# Altium footprint library Dip Switches.PcbLib: 39 footprints (part 2 of 3)
Each footprint in its own frame and in the unit in brackets; x right, y up, seen from the top. Pads: shape width x height; smd on the part's side, far side on the other; paste and mask are expansions set on the pad; w line width, h text height; cw(c..) or ccw(c..) is an arc to the next point about the centre after c.
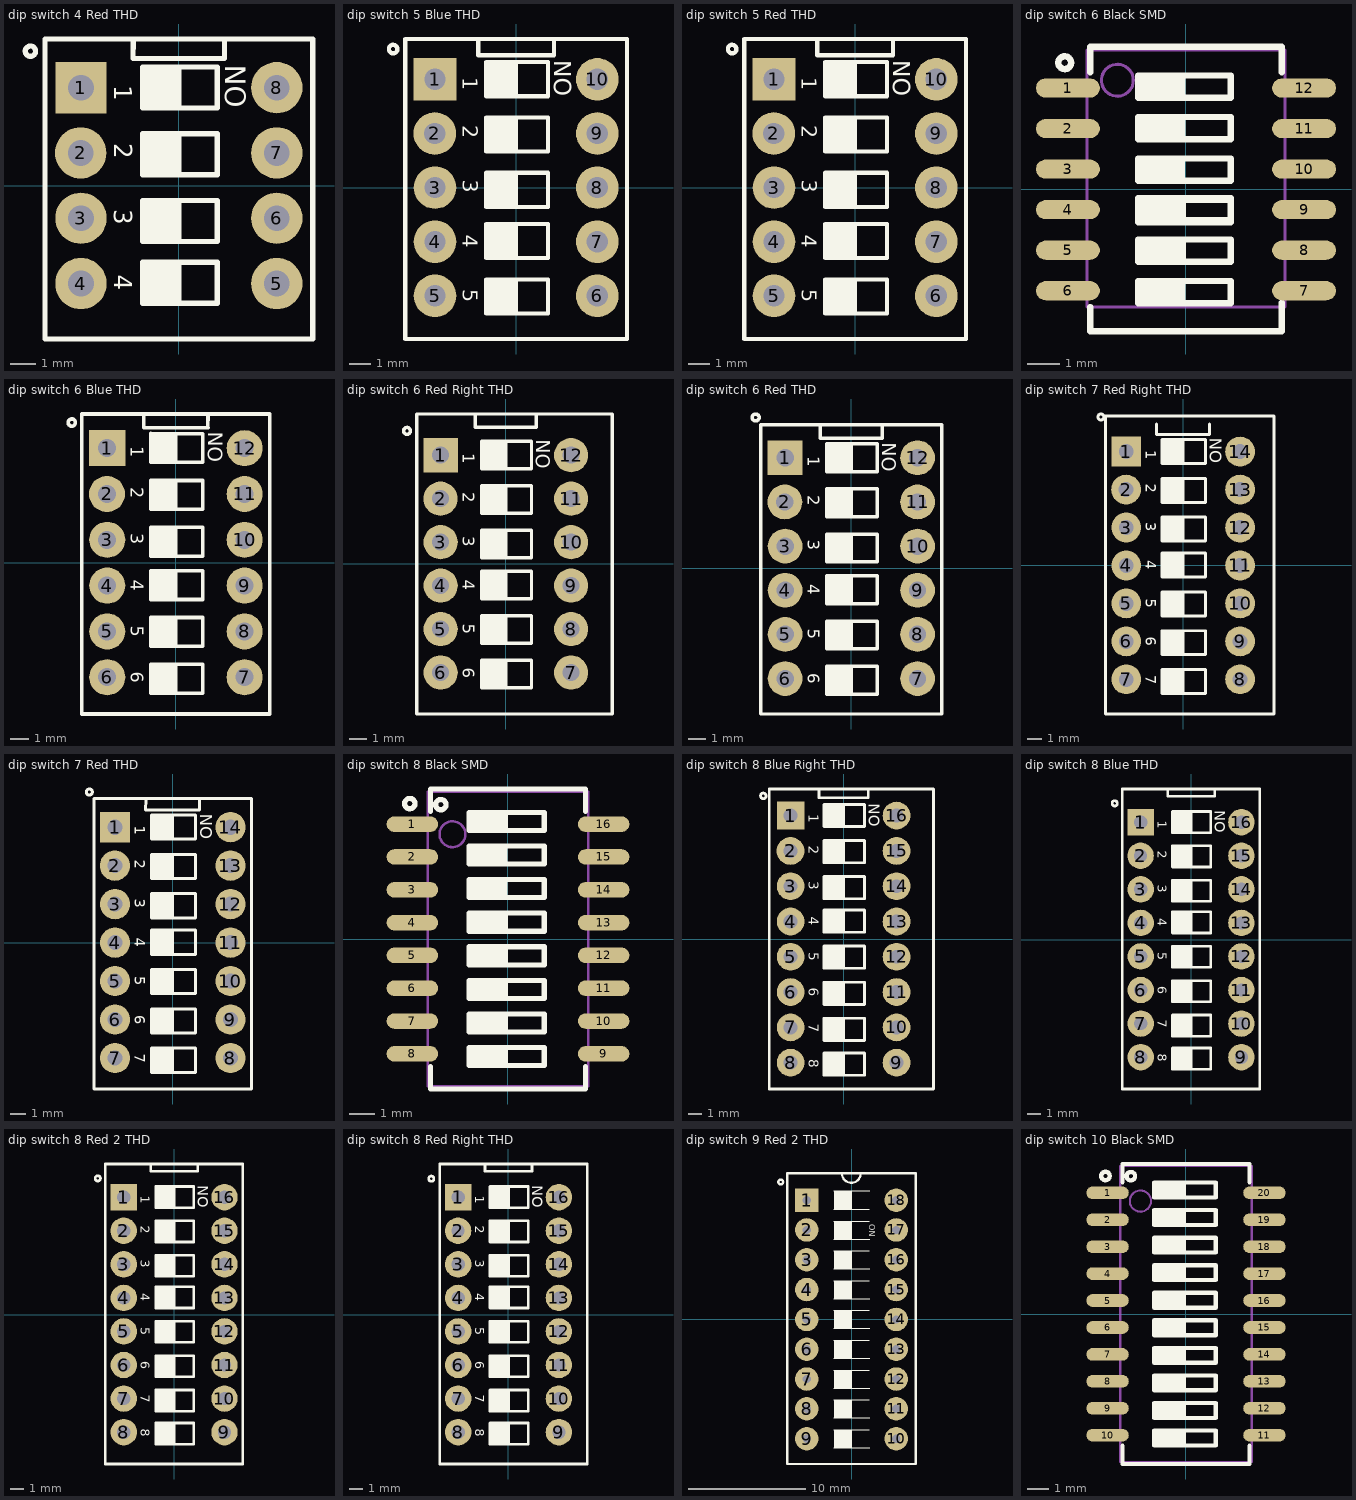
[diagram p1: the footprints below, top view; thin cyan lines are the x and y axes]

## dip switch 4 Red THD [mm]
height 6.5
pads (8):
  rect 2x2 hole 1: 1(-3.805,3.81)
  round 2 hole 1: 2(-3.815,1.27) 3(-3.805,-1.27) 4(-3.805,-3.81) 5(3.815,-3.81) 6(3.815,-1.27) 7(3.815,1.27) 8(3.815,3.81)
Top Overlay:
  circle w0.2: c-5.771,5.23 r0.2
  rectangle: -1.4,-4.58 0.1,-2.98
  rectangle: -1.4,-2.18 0.1,-0.58
  rectangle: -1.4,0.42 0.1,2.02
  rectangle: -1.4,3.02 0.1,4.62
  lines w0.2: -1.782,4.942 -1.773,5.656 ; -1.773,4.942 1.783,4.942 ; 1.774,4.942 1.783,5.656 ; -5.207,-5.969 -5.207,5.704 5.212,5.704 5.212,-5.969 -5.207,-5.969 ; -1.4,-4.58 1.5,-4.58 1.5,-2.98 -1.4,-2.98 -1.4,-4.58 ; -1.4,-2.18 1.5,-2.18 1.5,-0.58 -1.4,-0.58 -1.4,-2.18 ; -1.4,0.42 -1.4,2.02 1.5,2.02 1.5,0.42 -1.4,0.42 ; -1.4,3.02 -1.4,4.62 1.5,4.62 1.5,3.02 -1.4,3.02
  text "4" at -2.51,-3.474 h0.7
  text "3" at -2.51,-0.913 h0.7
  text "1" at -2.51,3.911 h0.7
  text "2" at -2.51,1.647 h0.7
  text "ON" at 2.6,3.02 h0.8
Mechanical 1:
  circle w0.025: c3.816,-3.803 r0.254
  circle w0.025: c-3.804,-3.803 r0.254
  circle w0.025: c3.816,-1.263 r0.254
  circle w0.025: c-3.804,-1.263 r0.254
  circle w0.025: c3.816,1.277 r0.254
  circle w0.025: c-3.814,1.277 r0.254
  circle w0.025: c3.816,3.817 r0.254
  circle w0.025: c-3.804,3.817 r0.254
3D body: height 6.35, standoff 0.25, extent -1.441,3.055 -0.73,4.579
3D body: height 0.76, standoff 0, extent 3.563,3.563 4.07,4.07
3D body: height 0.76, standoff 0, extent 3.563,1.023 4.07,1.53
3D body: height 0.76, standoff 0, extent 3.563,-1.517 4.07,-1.01
3D body: height 0.76, standoff 0, extent 3.563,-4.057 4.07,-3.55
3D body: height 0.76, standoff 0, extent -4.057,3.563 -3.55,4.07
3D body: height 0.76, standoff 0, extent -4.067,1.023 -3.56,1.53
3D body: height 0.76, standoff 0, extent -4.057,-1.517 -3.55,-1.01
3D body: height 0.76, standoff 0, extent -4.057,-4.057 -3.55,-3.55
3D body: height 3.81, standoff 0, extent -1.904,5.29 1.906,5.798
3D body: height 5.08, standoff 0.25, extent -0.73,3.055 1.449,4.579
3D body: height 5.08, standoff 0.25, extent -0.73,-2.025 1.449,-0.501
3D body: height 6.35, standoff 0.25, extent -1.441,-2.025 -0.73,-0.501
3D body: height 5.08, standoff 0.25, extent -0.73,-4.565 1.449,-3.041
3D body: height 6.35, standoff 0.25, extent -1.441,-4.565 -0.73,-3.041
3D body: height 5.59, standoff 0, extent -1.441,-3.041 1.449,-2.025
3D body: height 5.08, standoff 0.25, extent -0.73,0.515 1.449,2.039
3D body: height 6.35, standoff 0.25, extent -1.441,0.515 -0.73,2.039
3D body: height 5.59, standoff 0, extent -1.441,2.039 1.449,3.055
3D body: height 5.59, standoff 0, extent -1.441,4.579 1.449,5.29
3D body: height 5.59, standoff 0, extent -1.441,-0.501 1.449,0.515
3D body: height 5.59, standoff 0, extent -4.947,-5.835 4.959,5.798
3D body: height 0.25, standoff 0.05, extent -4.947,-5.835 4.959,5.798

## dip switch 5 Blue THD [mm]
height 6.5
pads (10):
  rect 2x2 hole 1: 1(-3.805,5.08)
  round 2 hole 1: 2(-3.815,2.54) 3(-3.805,0) 4(-3.805,-2.54) 5(-3.805,-5.08) 6(3.815,-5.08) 7(3.815,-2.54) 8(3.815,0) 9(3.815,2.54) 10(3.815,5.08)
Top Overlay:
  circle w0.2: c-5.771,6.5 r0.2
  rectangle: -1.4,4.29 0.1,5.89
  rectangle: -1.4,1.69 0.1,3.29
  rectangle: -1.4,-0.91 0.1,0.69
  rectangle: -1.4,-3.31 0.1,-1.71
  rectangle: -1.4,-5.91 0.1,-4.31
  lines w0.2: -1.782,6.212 -1.773,6.926 ; -1.773,6.212 1.783,6.212 ; 1.774,6.212 1.783,6.926 ; -5.207,-7.108 5.212,-7.108 5.212,6.974 -5.207,6.974 -5.207,-7.108 ; -1.4,-5.91 -1.4,-4.31 1.5,-4.31 1.5,-5.91 -1.4,-5.91 ; -1.4,-3.31 -1.4,-1.71 1.5,-1.71 1.5,-3.31 -1.4,-3.31 ; -1.4,-0.91 -1.4,0.69 1.5,0.69 1.5,-0.91 -1.4,-0.91 ; -1.4,1.69 -1.4,3.29 1.5,3.29 1.5,1.69 -1.4,1.69 ; -1.4,4.29 -1.4,5.89 1.5,5.89 1.5,4.29 -1.4,4.29
  text "5" at -2.51,-4.764 h0.7
  text "4" at -2.51,-2.204 h0.7
  text "ON" at 2.6,4.29 h0.8
  text "2" at -2.51,2.917 h0.7
  text "3" at -2.51,0.357 h0.7
  text "1" at -2.51,5.181 h0.7
3D body "User Library-DIP-10.step": height 7, standoff -3.7, extent -4.947,-6.85 4.953,6.85

## dip switch 5 Red THD [mm]
height 6.5
pads (10):
  rect 2x2 hole 1: 1(-3.805,5.08)
  round 2 hole 1: 2(-3.815,2.54) 3(-3.805,0) 4(-3.805,-2.54) 5(-3.805,-5.08) 6(3.815,-5.08) 7(3.815,-2.54) 8(3.815,0) 9(3.815,2.54) 10(3.815,5.08)
Top Overlay:
  circle w0.2: c-5.771,6.5 r0.2
  rectangle: -1.4,4.29 0.1,5.89
  rectangle: -1.4,1.69 0.1,3.29
  rectangle: -1.4,-0.91 0.1,0.69
  rectangle: -1.4,-3.31 0.1,-1.71
  rectangle: -1.4,-5.91 0.1,-4.31
  lines w0.2: -1.782,6.212 -1.773,6.926 ; -1.773,6.212 1.783,6.212 ; 1.774,6.212 1.783,6.926 ; -5.207,-7.108 5.212,-7.108 5.212,6.974 -5.207,6.974 -5.207,-7.108 ; -1.4,-5.91 -1.4,-4.31 1.5,-4.31 1.5,-5.91 -1.4,-5.91 ; -1.4,-3.31 -1.4,-1.71 1.5,-1.71 1.5,-3.31 -1.4,-3.31 ; -1.4,-0.91 -1.4,0.69 1.5,0.69 1.5,-0.91 -1.4,-0.91 ; -1.4,1.69 -1.4,3.29 1.5,3.29 1.5,1.69 -1.4,1.69 ; -1.4,4.29 -1.4,5.89 1.5,5.89 1.5,4.29 -1.4,4.29
  text "ON" at 2.6,4.29 h0.8
  text "1" at -2.51,5.181 h0.7
  text "2" at -2.51,2.917 h0.7
  text "3" at -2.51,0.357 h0.7
  text "4" at -2.51,-2.204 h0.7
  text "5" at -2.51,-4.764 h0.7
3D body "User Library-DS1040-05 (DIP_switch).step": height 6.8, standoff -3.85, extent -4.947,-7.207 4.953,6.953

## dip switch 6 Black SMD [mm] "SWITCH DIP 6POS, SMD, 1.27mm, 6.1X6.2mm , TDA series"
height 2.3
pads (12):
  oval 2x0.6 smd: 1(-3.7,3.175) 2(-3.7,1.905) 3(-3.7,0.635) 4(-3.7,-0.635) 5(-3.7,-1.905) 6(-3.7,-3.175) 7(3.7,-3.175) 8(3.7,-1.905) 9(3.7,-0.635) 10(3.7,0.635) 11(3.7,1.905) 12(3.7,3.175)
Top Overlay:
  circle w0.2: c-3.8,3.97 r0.2
  rectangle: -1.519,-3.531 -0.019,-2.931
  rectangle: -1.496,-2.232 0.004,-1.632
  rectangle: -1.5,-0.87 0,-0.27
  rectangle: -1.5,-0.93 0,-0.33
  rectangle: -1.533,0.318 -0.033,0.918
  rectangle: -1.521,1.651 -0.021,2.251
  rectangle: -1.509,2.937 -0.009,3.537
  lines w0.2: -3,-3.683 -3,-4.445 3,-4.445 3,-3.556 ; -3,3.67 -3,4.47 3,4.47 3,3.67 ; -1.5,-3.57 -1.5,-2.87 1.4,-2.87 1.4,-3.57 -1.5,-3.57 ; -1.5,-2.27 -1.5,-1.57 1.4,-1.57 1.4,-2.27 -1.5,-2.27 ; -1.5,-1.03 -1.5,-0.33 1.4,-0.33 1.4,-1.03 -1.5,-1.03 ; -1.5,-0.97 -1.5,-0.27 1.4,-0.27 1.4,-0.97 -1.5,-0.97 ; -1.5,0.27 -1.5,0.97 1.4,0.97 1.4,0.27 -1.5,0.27 ; -1.5,1.57 -1.5,2.27 1.4,2.27 1.4,1.57 -1.5,1.57 ; -1.5,2.87 -1.5,3.57 1.4,3.57 1.4,2.87 -1.5,2.87
Mechanical 13:
  circle w0.1: c-2.15,3.42 r0.5
  lines w0.1: -3.1,-3.683 -3.1,4.37 3.1,4.37 3.1,-3.683 -3.1,-3.683
3D body "User Library-DHN-06F.STEP": height 1.6, standoff 0, extent -3.35,-4.45 3.35,4.45

## dip switch 6 Blue THD [mm]
height 6.5
pads (12):
  rect 2x2 hole 1: 1(-3.805,6.35)
  round 2 hole 1: 2(-3.815,3.81) 3(-3.805,1.27) 4(-3.805,-1.27) 5(-3.805,-3.81) 6(-3.805,-6.35) 7(3.815,-6.35) 8(3.815,-3.81) 9(3.815,-1.27) 10(3.815,1.27) 11(3.815,3.81) 12(3.815,6.35)
Top Overlay:
  circle w0.2: c-5.771,7.77 r0.2
  rectangle: -1.4,-7.24 0.1,-5.64
  rectangle: -1.4,-4.64 0.1,-3.04
  rectangle: -1.4,-2.04 0.1,-0.44
  rectangle: -1.4,0.36 0.1,1.96
  rectangle: -1.4,2.96 0.1,4.56
  rectangle: -1.4,5.56 0.1,7.16
  lines w0.2: -1.782,7.482 -1.773,8.196 ; -1.773,7.482 1.783,7.482 ; 1.774,7.482 1.783,8.196 ; -5.207,-8.389 -5.207,8.244 5.212,8.244 5.212,-8.389 -5.207,-8.389 ; -1.4,-7.24 1.5,-7.24 1.5,-5.64 -1.4,-5.64 -1.4,-7.24 ; -1.4,-4.64 1.5,-4.64 1.5,-3.04 -1.4,-3.04 -1.4,-4.64 ; -1.4,-2.04 1.5,-2.04 1.5,-0.44 -1.4,-0.44 -1.4,-2.04 ; -1.4,0.36 1.5,0.36 1.5,1.96 -1.4,1.96 -1.4,0.36 ; -1.4,2.96 1.5,2.96 1.5,4.56 -1.4,4.56 -1.4,2.96 ; -1.4,5.56 1.5,5.56 1.5,7.16 -1.4,7.16 -1.4,5.56
  text "6" at -2.51,-6.055 h0.7
  text "5" at -2.51,-3.494 h0.7
  text "4" at -2.51,-0.934 h0.7
  text "3" at -2.51,1.627 h0.7
  text "2" at -2.51,4.187 h0.7
  text "1" at -2.51,6.451 h0.7
  text "ON" at 2.6,5.56 h0.8
3D body "User Library-106S.STEP": height 6.97, standoff -1.89, extent -4.815,-8.319 4.885,8.381

## dip switch 6 Red Right THD [mm]
height 6.5
pads (12):
  rect 2x2 hole 1: 1(-3.805,6.35)
  round 2 hole 1: 2(-3.815,3.81) 3(-3.805,1.27) 4(-3.805,-1.27) 5(-3.805,-3.81) 6(-3.805,-6.35) 7(3.815,-6.35) 8(3.815,-3.81) 9(3.815,-1.27) 10(3.815,1.27) 11(3.815,3.81) 12(3.815,6.35)
Top Overlay:
  circle w0.2: c-5.771,7.77 r0.2
  rectangle: -1.4,5.56 0.1,7.16
  rectangle: -1.4,2.96 0.1,4.56
  rectangle: -1.4,0.36 0.1,1.96
  rectangle: -1.4,-2.04 0.1,-0.44
  rectangle: -1.4,-4.64 0.1,-3.04
  rectangle: -1.4,-7.24 0.1,-5.64
  lines w0.2: -1.782,7.99 -1.773,8.704 ; -1.773,7.99 1.783,7.99 ; 1.774,7.99 1.783,8.704 ; -5.207,-8.77 6.227,-8.77 6.227,8.756 -5.207,8.756 -5.207,-8.77 ; -1.4,-7.24 -1.4,-5.64 1.5,-5.64 1.5,-7.24 -1.4,-7.24 ; -1.4,-4.64 -1.4,-3.04 1.5,-3.04 1.5,-4.64 -1.4,-4.64 ; -1.4,-2.04 -1.4,-0.44 1.5,-0.44 1.5,-2.04 -1.4,-2.04 ; -1.4,0.36 -1.4,1.96 1.5,1.96 1.5,0.36 -1.4,0.36 ; -1.4,2.96 -1.4,4.56 1.5,4.56 1.5,2.96 -1.4,2.96 ; -1.4,5.56 -1.4,7.16 1.5,7.16 1.5,5.56 -1.4,5.56
  text "ON" at 2.6,5.56 h0.8
  text "1" at -2.51,6.451 h0.7
  text "2" at -2.51,4.187 h0.7
  text "3" at -2.51,1.627 h0.7
  text "4" at -2.51,-0.934 h0.7
  text "5" at -2.51,-3.494 h0.7
  text "6" at -2.51,-6.055 h0.7
3D body "User Library-DIP SW 6P TH RA.step": height 7.9, standoff -3.8, extent -4.886,-8.717 6.034,8.703

## dip switch 6 Red THD [mm]
height 6.5
pads (12):
  rect 2x2 hole 1: 1(-3.805,6.35)
  round 2 hole 1: 2(-3.815,3.81) 3(-3.805,1.27) 4(-3.805,-1.27) 5(-3.805,-3.81) 6(-3.805,-6.35) 7(3.815,-6.35) 8(3.815,-3.81) 9(3.815,-1.27) 10(3.815,1.27) 11(3.815,3.81) 12(3.815,6.35)
Top Overlay:
  circle w0.2: c-5.5,8.67 r0.2
  rectangle: -1.4,-7.24 0.1,-5.64
  rectangle: -1.4,-4.64 0.1,-3.04
  rectangle: -1.4,-2.04 0.1,-0.44
  rectangle: -1.4,0.36 0.1,1.96
  rectangle: -1.4,2.96 0.1,4.56
  rectangle: -1.4,5.56 0.1,7.16
  lines w0.2: -1.782,7.482 -1.773,8.196 ; -1.773,7.482 1.783,7.482 ; 1.774,7.482 1.783,8.196 ; -5.207,-8.389 -5.207,8.244 5.212,8.244 5.212,-8.389 -5.207,-8.389 ; -1.4,-7.24 1.5,-7.24 1.5,-5.64 -1.4,-5.64 -1.4,-7.24 ; -1.4,-4.64 1.5,-4.64 1.5,-3.04 -1.4,-3.04 -1.4,-4.64 ; -1.4,-2.04 1.5,-2.04 1.5,-0.44 -1.4,-0.44 -1.4,-2.04 ; -1.4,0.36 1.5,0.36 1.5,1.96 -1.4,1.96 -1.4,0.36 ; -1.4,2.96 1.5,2.96 1.5,4.56 -1.4,4.56 -1.4,2.96 ; -1.4,5.56 1.5,5.56 1.5,7.16 -1.4,7.16 -1.4,5.56
  text "6" at -2.51,-6.055 h0.7
  text "5" at -2.51,-3.494 h0.7
  text "4" at -2.51,-0.934 h0.7
  text "3" at -2.51,1.627 h0.7
  text "2" at -2.51,4.187 h0.7
  text "1" at -2.51,6.451 h0.7
  text "ON" at 2.6,5.56 h0.8
3D body "User Library-DS1040-06 (DIP_switch).step": height 6.8, standoff -3.85, extent -4.955,-8.357 4.945,8.344

## dip switch 7 Red Right THD [mm]
height 6.5
pads (14):
  rect 2x2 hole 1: 1(-3.805,7.62)
  round 2 hole 1: 2(-3.815,5.08) 3(-3.805,2.54) 4(-3.805,0) 5(-3.805,-2.54) 6(-3.805,-5.08) 7(-3.805,-7.62) 8(3.815,-7.62) 9(3.815,-5.08) 10(3.815,-2.54) 11(3.815,0) 12(3.815,2.54) 13(3.815,5.08) 14(3.815,7.62)
Top Overlay:
  circle w0.2: c-5.5,9.94 r0.2
  rectangle: -1.4,-8.57 0.1,-6.97
  rectangle: -1.4,-5.97 0.1,-4.37
  rectangle: -1.4,-3.37 0.1,-1.77
  rectangle: -1.4,-0.77 0.1,0.83
  rectangle: -1.4,1.63 0.1,3.23
  rectangle: -1.4,4.23 0.1,5.83
  rectangle: -1.4,6.83 0.1,8.43
  lines w0.2: -1.782,8.752 -1.773,9.466 ; -1.773,8.752 1.783,8.752 ; 1.774,8.752 1.783,9.466 ; -5.207,-9.943 -5.207,9.996 6.088,9.996 6.088,-9.943 -5.207,-9.943 ; -1.4,-8.57 1.5,-8.57 1.5,-6.97 -1.4,-6.97 -1.4,-8.57 ; -1.4,-5.97 1.5,-5.97 1.5,-4.37 -1.4,-4.37 -1.4,-5.97 ; -1.4,-3.37 1.5,-3.37 1.5,-1.77 -1.4,-1.77 -1.4,-3.37 ; -1.4,-0.77 1.5,-0.77 1.5,0.83 -1.4,0.83 -1.4,-0.77 ; -1.4,1.63 1.5,1.63 1.5,3.23 -1.4,3.23 -1.4,1.63 ; -1.4,4.23 1.5,4.23 1.5,5.83 -1.4,5.83 -1.4,4.23 ; -1.4,6.83 1.5,6.83 1.5,8.43 -1.4,8.43 -1.4,6.83
  text "7" at -2.51,-7.345 h0.7
  text "6" at -2.51,-4.785 h0.7
  text "5" at -2.51,-2.224 h0.7
  text "4" at -2.51,0.336 h0.7
  text "3" at -2.51,2.897 h0.7
  text "2" at -2.51,5.457 h0.7
  text "1" at -2.51,7.721 h0.7
  text "ON" at 2.6,6.83 h0.8
3D body "User Library-DIP SW 7P TH RA.step": height 7.9, standoff -3.8, extent -4.897,-10.017 6.023,9.943

## dip switch 7 Red THD [mm]
height 6.5
pads (14):
  rect 2x2 hole 1: 1(-3.805,7.62)
  round 2 hole 1: 2(-3.815,5.08) 3(-3.805,2.54) 4(-3.805,0) 5(-3.805,-2.54) 6(-3.805,-5.08) 7(-3.805,-7.62) 8(3.815,-7.62) 9(3.815,-5.08) 10(3.815,-2.54) 11(3.815,0) 12(3.815,2.54) 13(3.815,5.08) 14(3.815,7.62)
Top Overlay:
  circle w0.2: c-5.5,9.94 r0.2
  rectangle: -1.4,6.83 0.1,8.43
  rectangle: -1.4,4.23 0.1,5.83
  rectangle: -1.4,1.63 0.1,3.23
  rectangle: -1.4,-0.77 0.1,0.83
  rectangle: -1.4,-3.37 0.1,-1.77
  rectangle: -1.4,-5.97 0.1,-4.37
  rectangle: -1.4,-8.57 0.1,-6.97
  lines w0.2: -1.782,8.752 -1.773,9.466 ; -1.773,8.752 1.783,8.752 ; 1.774,8.752 1.783,9.466 ; -5.207,-9.663 5.212,-9.663 5.212,9.514 -5.207,9.514 -5.207,-9.663 ; -1.4,-8.57 -1.4,-6.97 1.5,-6.97 1.5,-8.57 -1.4,-8.57 ; -1.4,-5.97 -1.4,-4.37 1.5,-4.37 1.5,-5.97 -1.4,-5.97 ; -1.4,-3.37 -1.4,-1.77 1.5,-1.77 1.5,-3.37 -1.4,-3.37 ; -1.4,-0.77 -1.4,0.83 1.5,0.83 1.5,-0.77 -1.4,-0.77 ; -1.4,1.63 -1.4,3.23 1.5,3.23 1.5,1.63 -1.4,1.63 ; -1.4,4.23 -1.4,5.83 1.5,5.83 1.5,4.23 -1.4,4.23 ; -1.4,6.83 -1.4,8.43 1.5,8.43 1.5,6.83 -1.4,6.83
  text "ON" at 2.6,6.83 h0.8
  text "1" at -2.51,7.721 h0.7
  text "2" at -2.51,5.457 h0.7
  text "3" at -2.51,2.897 h0.7
  text "4" at -2.51,0.336 h0.7
  text "5" at -2.51,-2.224 h0.7
  text "6" at -2.51,-4.785 h0.7
  text "7" at -2.51,-7.345 h0.7
3D body "User Library-DS1040-07 (DIP_switch).step": height 6.8, standoff -3.85, extent -4.954,-9.631 4.946,9.609

## dip switch 8 Black SMD [mm] "SWITCH DIP 8POS, SMD, 1.27mm, 6.1X11.3mm ,TDA series"
height 2.3
pads (16):
  oval 2x0.6 smd: 1(-3.7,4.445) 2(-3.7,3.175) 3(-3.7,1.905) 4(-3.7,0.635) 5(-3.7,-0.635) 6(-3.7,-1.905) 7(-3.7,-3.175) 8(-3.7,-4.445) 9(3.7,-4.445) 10(3.7,-3.175) 11(3.7,-1.905) 12(3.7,-0.635) 13(3.7,0.635) 14(3.7,1.905) 15(3.7,3.175) 16(3.7,4.445)
Top Overlay:
  circle w0.2: c-2.6,5.2 r0.2
  circle w0.2: c-3.8,5.24 r0.2
  rectangle: -1.508,4.278 -0.008,4.878
  rectangle: -1.517,2.975 -0.017,3.575
  rectangle: -1.517,1.628 -0.017,2.228
  rectangle: -1.508,0.361 -0.008,0.961
  rectangle: -1.505,-0.91 -0.005,-0.31
  rectangle: -1.505,-2.208 -0.005,-1.608
  rectangle: -1.501,-3.519 -0.001,-2.919
  rectangle: -1.5,-4.8 0,-4.2
  lines w0.2: -3,-4.94 -3,-5.805 3,-5.805 3,-4.94 ; -3,4.94 -3,5.805 3,5.805 3,4.94 ; -1.5,-4.9 1.4,-4.9 1.4,-4.2 -1.5,-4.2 -1.5,-4.9 ; -1.5,-3.6 1.4,-3.6 1.4,-2.9 -1.5,-2.9 -1.5,-3.6 ; -1.5,-2.3 1.4,-2.3 1.4,-1.6 -1.5,-1.6 -1.5,-2.3 ; -1.5,-1 1.4,-1 1.4,-0.3 -1.5,-0.3 -1.5,-1 ; -1.5,0.3 1.4,0.3 1.4,1 -1.5,1 -1.5,0.3 ; -1.5,1.6 1.4,1.6 1.4,2.3 -1.5,2.3 -1.5,1.6 ; -1.5,2.9 1.4,2.9 1.4,3.6 -1.5,3.6 -1.5,2.9 ; -1.5,4.2 1.4,4.2 1.4,4.9 -1.5,4.9 -1.5,4.2
Mechanical 13:
  circle w0.1: c-2.15,4.055 r0.5
  lines w0.1: -3.1,-5.705 3.1,-5.705 3.1,5.705 -3.1,5.705 -3.1,-5.705
3D body "218-8polesLP.STP": height 2.57, standoff -0.05, extent -4.22,-5.665 4.22,5.665

## dip switch 8 Blue Right THD [mm]
height 6.5
pads (16):
  rect 2x2 hole 1: 1(-3.805,8.89)
  round 2 hole 1: 2(-3.815,6.35) 3(-3.805,3.81) 4(-3.805,1.27) 5(-3.805,-1.27) 6(-3.805,-3.81) 7(-3.805,-6.35) 8(-3.805,-8.89) 9(3.815,-8.89) 10(3.815,-6.35) 11(3.815,-3.81) 12(3.815,-1.27) 13(3.815,1.27) 14(3.815,3.81) 15(3.815,6.35) 16(3.815,8.89)
Top Overlay:
  circle w0.2: c-5.771,10.31 r0.2
  rectangle: -1.4,-9.8 0.1,-8.2
  rectangle: -1.4,-7.3 0.1,-5.7
  rectangle: -1.4,-4.7 0.1,-3.1
  rectangle: -1.4,-2.1 0.1,-0.5
  rectangle: -1.4,0.5 0.1,2.1
  rectangle: -1.4,2.9 0.1,4.5
  rectangle: -1.4,5.5 0.1,7.1
  rectangle: -1.4,8.1 0.1,9.7
  lines w0.2: -1.773,10.795 -1.773,10.171 1.783,10.171 1.783,10.806 ; -5.34,-10.784 -5.34,10.806 6.471,10.806 6.471,-10.784 -5.34,-10.784 ; -1.4,-9.8 1.5,-9.8 1.5,-8.2 -1.4,-8.2 -1.4,-9.8 ; -1.4,-7.3 1.5,-7.3 1.5,-5.7 -1.4,-5.7 -1.4,-7.3 ; -1.4,-4.7 1.5,-4.7 1.5,-3.1 -1.4,-3.1 -1.4,-4.7 ; -1.4,-2.1 1.5,-2.1 1.5,-0.5 -1.4,-0.5 -1.4,-2.1 ; -1.4,0.5 1.5,0.5 1.5,2.1 -1.4,2.1 -1.4,0.5 ; -1.4,2.9 1.5,2.9 1.5,4.5 -1.4,4.5 -1.4,2.9 ; -1.4,5.5 1.5,5.5 1.5,7.1 -1.4,7.1 -1.4,5.5 ; -1.4,8.1 1.5,8.1 1.5,9.7 -1.4,9.7 -1.4,8.1
  text "8" at -2.51,-8.636 h0.7
  text "7" at -2.51,-6.075 h0.7
  text "6" at -2.51,-3.515 h0.7
  text "5" at -2.51,-0.954 h0.7
  text "4" at -2.51,1.606 h0.7
  text "3" at -2.51,4.167 h0.7
  text "2" at -2.51,6.727 h0.7
  text "1" at -2.51,8.991 h0.7
  text "ON" at 2.6,8.1 h0.8
3D body "User Library-Dip_Switch_Piano_8ways.STEP": height 9.2, standoff -3, extent -5.213,-10.612 6.387,10.888

## dip switch 8 Blue THD [mm] "SWITCH DIP 8POS, THD, 2.54mm"
height 6.5
pads (16):
  rect 2x2 hole 1: 1(-3.805,8.89)
  round 2 hole 1: 2(-3.815,6.35) 3(-3.805,3.81) 4(-3.805,1.27) 5(-3.805,-1.27) 6(-3.805,-3.81) 7(-3.805,-6.35) 8(-3.805,-8.89) 9(3.815,-8.89) 10(3.815,-6.35) 11(3.815,-3.81) 12(3.815,-1.27) 13(3.815,1.27) 14(3.815,3.81) 15(3.815,6.35) 16(3.815,8.89)
Top Overlay:
  circle w0.2: c-5.771,10.31 r0.2
  rectangle: -1.4,-9.8 0.1,-8.2
  rectangle: -1.4,-7.3 0.1,-5.7
  rectangle: -1.4,-4.7 0.1,-3.1
  rectangle: -1.4,-2.1 0.1,-0.5
  rectangle: -1.4,0.5 0.1,2.1
  rectangle: -1.4,2.9 0.1,4.5
  rectangle: -1.4,5.5 0.1,7.1
  rectangle: -1.4,8.1 0.1,9.7
  lines w0.2: -1.773,11.371 -1.773,10.863 1.783,10.863 1.783,11.371 ; -5.207,-11.3 -5.207,11.4 5.212,11.4 5.212,-11.3 -5.207,-11.3 ; -1.4,-9.8 1.5,-9.8 1.5,-8.2 -1.4,-8.2 -1.4,-9.8 ; -1.4,-7.3 1.5,-7.3 1.5,-5.7 -1.4,-5.7 -1.4,-7.3 ; -1.4,-4.7 1.5,-4.7 1.5,-3.1 -1.4,-3.1 -1.4,-4.7 ; -1.4,-2.1 1.5,-2.1 1.5,-0.5 -1.4,-0.5 -1.4,-2.1 ; -1.4,0.5 1.5,0.5 1.5,2.1 -1.4,2.1 -1.4,0.5 ; -1.4,2.9 1.5,2.9 1.5,4.5 -1.4,4.5 -1.4,2.9 ; -1.4,5.5 1.5,5.5 1.5,7.1 -1.4,7.1 -1.4,5.5 ; -1.4,8.1 1.5,8.1 1.5,9.7 -1.4,9.7 -1.4,8.1
  text "8" at -2.51,-8.636 h0.7
  text "7" at -2.51,-6.075 h0.7
  text "6" at -2.51,-3.515 h0.7
  text "5" at -2.51,-0.954 h0.7
  text "4" at -2.51,1.606 h0.7
  text "3" at -2.51,4.167 h0.7
  text "2" at -2.51,6.727 h0.7
  text "1" at -2.51,8.991 h0.7
  text "ON" at 2.6,8.1 h0.8
3D body "SW3dPS-DIP SWITCH 8 POS CTS 206.STEP": height 8.25, standoff -3.5, extent -4.895,-11.217 4.885,11.283

## dip switch 8 Red 2 THD [mm]
height 6.5
pads (16):
  rect 2x2 hole 1: 1(-3.805,8.89)
  round 2 hole 1: 2(-3.815,6.35) 3(-3.805,3.81) 4(-3.805,1.27) 5(-3.805,-1.27) 6(-3.805,-3.81) 7(-3.805,-6.35) 8(-3.805,-8.89) 9(3.815,-8.89) 10(3.815,-6.35) 11(3.815,-3.81) 12(3.815,-1.27) 13(3.815,1.27) 14(3.815,3.81) 15(3.815,6.35) 16(3.815,8.89)
Top Overlay:
  circle w0.2: c-5.771,10.31 r0.2
  rectangle: -1.4,8.1 0.1,9.7
  rectangle: -1.4,5.5 0.1,7.1
  rectangle: -1.4,2.9 0.1,4.5
  rectangle: -1.4,0.5 0.1,2.1
  rectangle: -1.4,-2.1 0.1,-0.5
  rectangle: -1.4,-4.7 0.1,-3.1
  rectangle: -1.4,-7.3 0.1,-5.7
  rectangle: -1.4,-9.8 0.1,-8.2
  lines w0.2: -1.773,11.371 -1.773,10.863 1.783,10.863 1.783,11.371 ; -5.207,-11.3 5.203,-11.3 5.203,11.4 -5.207,11.4 -5.207,-11.3 ; -1.4,-9.8 -1.4,-8.2 1.5,-8.2 1.5,-9.8 -1.4,-9.8 ; -1.4,-7.3 -1.4,-5.7 1.5,-5.7 1.5,-7.3 -1.4,-7.3 ; -1.4,-4.7 -1.4,-3.1 1.5,-3.1 1.5,-4.7 -1.4,-4.7 ; -1.4,-2.1 -1.4,-0.5 1.5,-0.5 1.5,-2.1 -1.4,-2.1 ; -1.4,0.5 -1.4,2.1 1.5,2.1 1.5,0.5 -1.4,0.5 ; -1.4,2.9 -1.4,4.5 1.5,4.5 1.5,2.9 -1.4,2.9 ; -1.4,5.5 -1.4,7.1 1.5,7.1 1.5,5.5 -1.4,5.5 ; -1.4,8.1 -1.4,9.7 1.5,9.7 1.5,8.1 -1.4,8.1
  text "ON" at 2.6,8.1 h0.8
  text "1" at -2.51,8.991 h0.7
  text "2" at -2.51,6.727 h0.7
  text "3" at -2.51,4.167 h0.7
  text "4" at -2.51,1.606 h0.7
  text "5" at -2.51,-0.954 h0.7
  text "6" at -2.51,-3.515 h0.7
  text "7" at -2.51,-6.075 h0.7
  text "8" at -2.51,-8.636 h0.7
3D body "User Library-DS1040-08 (DIP_switch).step": height 6.8, standoff -3.85, extent -4.951,-10.892 4.949,10.888

## dip switch 8 Red Right THD [mm] "SWITCH DIP 8POS, THD, 2.54mm"
height 6.5
pads (16):
  rect 2x2 hole 1: 1(-3.805,8.89)
  round 2 hole 1: 2(-3.815,6.35) 3(-3.805,3.81) 4(-3.805,1.27) 5(-3.805,-1.27) 6(-3.805,-3.81) 7(-3.805,-6.35) 8(-3.805,-8.89) 9(3.815,-8.89) 10(3.815,-6.35) 11(3.815,-3.81) 12(3.815,-1.27) 13(3.815,1.27) 14(3.815,3.81) 15(3.815,6.35) 16(3.815,8.89)
Top Overlay:
  circle w0.2: c-5.842,10.287 r0.2
  rectangle: -1.4,8.1 0.1,9.7
  rectangle: -1.4,5.5 0.1,7.1
  rectangle: -1.4,2.9 0.1,4.5
  rectangle: -1.4,0.5 0.1,2.1
  rectangle: -1.4,-2.1 0.1,-0.5
  rectangle: -1.4,-4.7 0.1,-3.1
  rectangle: -1.4,-7.3 0.1,-5.7
  rectangle: -1.4,-9.8 0.1,-8.2
  lines w0.2: -1.773,11.371 -1.773,10.863 1.783,10.863 1.783,11.371 ; -5.207,-11.3 5.969,-11.3 5.969,11.4 -5.207,11.4 -5.207,-11.3 ; -1.4,-9.8 -1.4,-8.2 1.5,-8.2 1.5,-9.8 -1.4,-9.8 ; -1.4,-7.3 -1.4,-5.7 1.5,-5.7 1.5,-7.3 -1.4,-7.3 ; -1.4,-4.7 -1.4,-3.1 1.5,-3.1 1.5,-4.7 -1.4,-4.7 ; -1.4,-2.1 -1.4,-0.5 1.5,-0.5 1.5,-2.1 -1.4,-2.1 ; -1.4,0.5 -1.4,2.1 1.5,2.1 1.5,0.5 -1.4,0.5 ; -1.4,2.9 -1.4,4.5 1.5,4.5 1.5,2.9 -1.4,2.9 ; -1.4,5.5 -1.4,7.1 1.5,7.1 1.5,5.5 -1.4,5.5 ; -1.4,8.1 -1.4,9.7 1.5,9.7 1.5,8.1 -1.4,8.1
  text "ON" at 2.6,8.1 h0.8
  text "1" at -2.51,8.991 h0.7
  text "2" at -2.51,6.727 h0.7
  text "3" at -2.51,4.167 h0.7
  text "4" at -2.51,1.606 h0.7
  text "5" at -2.51,-0.954 h0.7
  text "6" at -2.51,-3.515 h0.7
  text "7" at -2.51,-6.075 h0.7
  text "8" at -2.51,-8.636 h0.7
3D body "User Library-DIP SW 8P TH RA.step": height 7.9, standoff -3.8, extent -4.952,-11.324 5.968,11.176

## dip switch 9 Red 2 THD [mm]
height 6.5
pads (18):
  rect 2x2 hole 0.7: 1(-3.81,10.16)
  round 2 hole 0.7: 2(-3.81,7.62) 3(-3.81,5.08) 4(-3.81,2.54) 5(-3.81,0) 6(-3.81,-2.54) 7(-3.81,-5.08) 8(-3.81,-7.62) 9(-3.81,-10.16) 10(3.81,-10.16) 11(3.81,-7.62) 12(3.81,-5.08) 13(3.81,-2.54) 14(3.81,0) 15(3.81,2.54) 16(3.81,5.08) 17(3.81,7.62) 18(3.81,10.16)
Top Overlay:
  circle w0.2: c-6.03,11.707 r0.2
  rectangle: -1.5,-10.946 0.025,-9.39
  rectangle: -1.5,-8.406 0.025,-6.85
  rectangle: -1.5,-0.786 0.025,0.77
  rectangle: -1.5,1.754 0.025,3.31
  rectangle: -1.5,4.294 0.025,5.85
  rectangle: -1.5,6.834 0.025,8.39
  rectangle: -1.5,9.384 0.025,10.94
  rectangle: -1.5,-5.866 0.025,-4.31
  rectangle: -1.5,-3.326 0.025,-1.77
  lines w0.1: -1.524,-10.93 1.55,-10.93 ; -1.524,-9.4 1.496,-9.4 ; -1.524,-8.39 1.55,-8.39 ; -1.524,-6.86 1.496,-6.86 ; -1.524,-5.85 1.55,-5.85 ; -1.524,-4.32 1.496,-4.32 ; -1.524,-3.31 1.55,-3.31 ; -1.524,-1.78 1.496,-1.78 ; -1.524,-0.77 1.55,-0.77 ; -1.524,0.76 1.496,0.76 ; -1.524,1.77 1.55,1.77 ; -1.524,3.3 1.496,3.3 ; -1.524,4.31 1.55,4.31 ; -1.524,5.84 1.496,5.84 ; -1.524,6.85 1.55,6.85 ; -1.524,8.38 1.496,8.38 ; -1.524,9.4 1.496,9.4 ; -1.524,10.94 1.55,10.94
  lines w0.2: -0.817,12.44 ccw(c-0.017,12.44) 0.783,12.44 ; -5.461,-12.319 5.461,-12.319 5.461,12.44 -5.461,12.44 -5.461,-12.319
  text "ON" at 1.524,8.128 h0.51
3D body "User Library-DS1040-09 (DIP_switch).step": height 6.8, standoff -3.85, extent -4.947,-12.16 4.953,12.16

## dip switch 10 Black SMD [mm] "SWITCH DIP 10POS, SMD, 1.27mm, 6.1X13.8mm"
height 2.3
pads (20):
  oval 2x0.6 smd: 1(-3.7,5.715) 2(-3.7,4.445) 3(-3.7,3.175) 4(-3.7,1.905) 5(-3.7,0.635) 6(-3.7,-0.635) 7(-3.7,-1.905) 8(-3.7,-3.175) 9(-3.7,-4.445) 10(-3.7,-5.715) 11(3.7,-5.715) 12(3.7,-4.445) 13(3.7,-3.175) 14(3.7,-1.905) 15(3.7,-0.635) 16(3.7,0.635) 17(3.7,1.905) 18(3.7,3.175) 19(3.7,4.445) 20(3.7,5.715)
Top Overlay:
  circle w0.2: c-2.6,6.5 r0.2
  circle w0.2: c-3.8,6.51 r0.2
  rectangle: -1.503,-6.133 -0.003,-5.533
  rectangle: -1.5,-4.858 0,-4.258
  rectangle: -1.505,-3.56 -0.005,-2.96
  rectangle: -1.5,-2.225 0,-1.625
  rectangle: -1.5,-0.93 0,-0.33
  rectangle: -1.503,0.377 -0.003,0.977
  rectangle: -1.505,1.66 -0.005,2.26
  rectangle: -1.5,2.987 0,3.587
  rectangle: -1.502,4.277 -0.002,4.877
  rectangle: -1.495,5.592 0.005,6.192
  lines w0.2: -3,-6.21 -3,-7.075 3,-7.075 3,-6.21 ; -3,6.21 -3,7.075 3,7.075 3,6.21 ; -1.5,-6.2 -1.5,-5.5 1.4,-5.5 1.4,-6.2 -1.5,-6.2 ; -1.5,-4.9 -1.5,-4.2 1.4,-4.2 1.4,-4.9 -1.5,-4.9 ; -1.5,-3.6 -1.5,-2.9 1.4,-2.9 1.4,-3.6 -1.5,-3.6 ; -1.5,-2.3 -1.5,-1.6 1.4,-1.6 1.4,-2.3 -1.5,-2.3 ; -1.5,-1 -1.5,-0.3 1.4,-0.3 1.4,-1 -1.5,-1 ; -1.5,0.3 -1.5,1 1.4,1 1.4,0.3 -1.5,0.3 ; -1.5,1.6 -1.5,2.3 1.4,2.3 1.4,1.6 -1.5,1.6 ; -1.5,2.9 -1.5,3.6 1.4,3.6 1.4,2.9 -1.5,2.9 ; -1.5,4.2 -1.5,4.9 1.4,4.9 1.4,4.2 -1.5,4.2 ; -1.5,5.5 -1.5,6.2 1.4,6.2 1.4,5.5 -1.5,5.5
Mechanical 13:
  circle w0.1: c-2.15,5.325 r0.5
  lines w0.1: -3.1,-6.975 -3.1,6.975 3.1,6.975 3.1,-6.975 -3.1,-6.975
3D body "218-10polesLP.STP": height 2.57, standoff -0.05, extent -4.22,-6.935 4.22,6.935